# Altium footprint library PcbLib1.PcbLib: 51 footprints (part 1 of 4)
Each footprint in its own frame and in the unit in brackets; x right, y up, seen from the top. Pads: shape width x height; smd on the part's side, far side on the other; paste and mask are expansions set on the pad; w line width, h text height; cw(c..) or ccw(c..) is an arc to the next point about the centre after c.
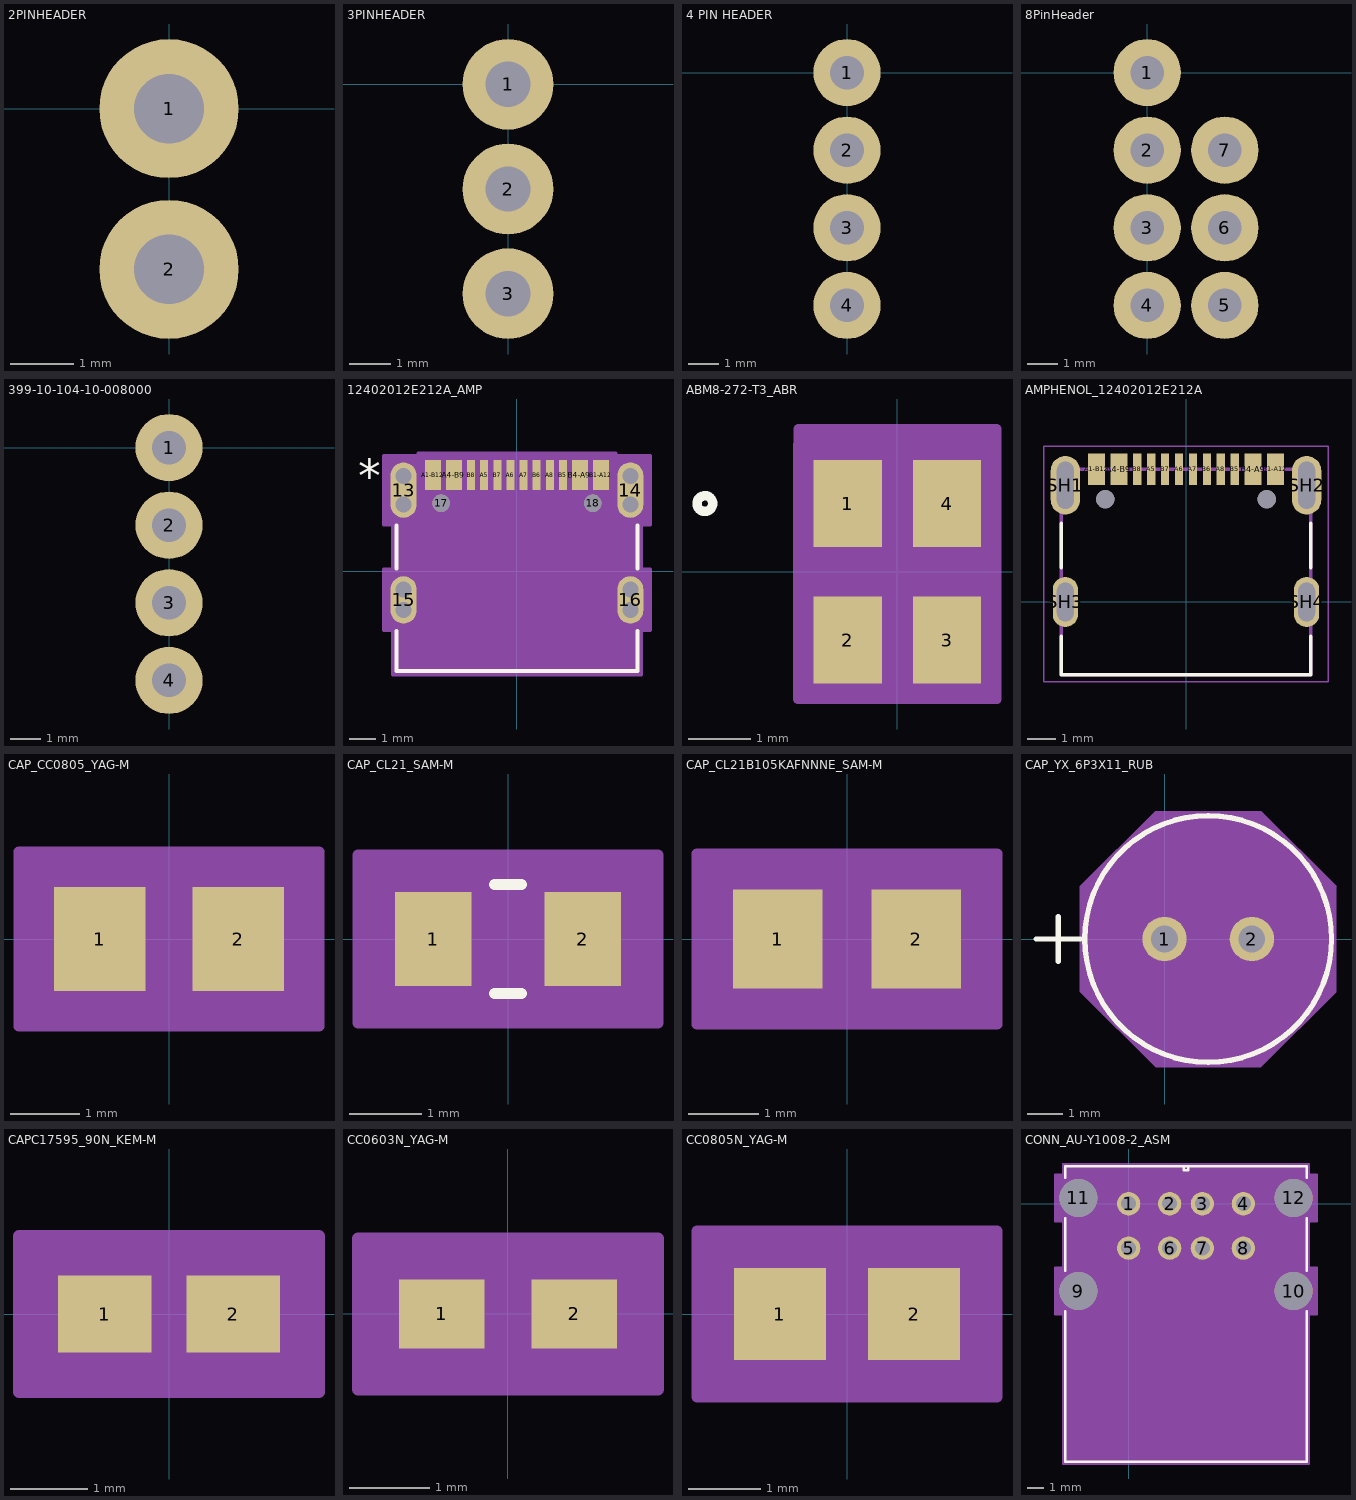
[diagram p0: the footprints below, top view; thin cyan lines are the x and y axes]

## 2PINHEADER [mm]
pads (2):
  round 2.2 hole 1.1: 1(0,0) 2(0,-2.54)

## 3PINHEADER [mm]
pads (3):
  round 2.2 hole 1.1: 1(0,0) 2(0,-2.54) 3(0,-5.08)

## 4 PIN HEADER [mm]
pads (4):
  round 2.2 hole 1.1: 1(0,0) 2(0,-2.54) 3(0,-5.08) 4(0,-7.62)

## 8PinHeader [mm]
pads (7):
  round 2.2 hole 1.1: 1(0,0) 2(0,-2.54) 3(0,-5.08) 4(0,-7.62) 5(2.54,-7.62) 6(2.54,-5.08) 7(2.54,-2.54)

## 399-10-104-10-008000 [mm]
pads (4):
  round 2.2 hole 1.1: 1(0,0) 2(0,-2.54) 3(0,-5.08) 4(0,-7.62)
3D body "mill-max-399-10-104-10-008000.STEP": height 2.95, standoff -2.79, extent -0.224,-8.814 5.588,1.346

## 12402012E212A_AMP [mil]
pads (26):
  oval 39x83 smd paste-41.5 mask-41.5: 13(-170.08,122.06) 14(170.08,122.06)
  oval 39x71 smd paste-35.5 mask-35.5: 15(-170.08,-42.51) 16(170.08,-42.51)
  round 26 / inner round 60 / far side round 26 hole 26 unplated paste-99999 mask-13: 17(-113.78,102.37) 18(113.78,102.37)
  rect 24x45 smd paste+0 mask+0: A1-B12(-125.98,144.5) A4-B9(-94.49,144.5) B1-A12(125.98,144.5) B4-A9(94.49,144.5)
  rect 12x45 smd paste+0 mask+0: A5(-49.21,144.5) A6(-9.84,144.5) A7(9.84,144.5) A8(49.21,144.5) B5(68.9,144.5) B6(29.53,144.5) B7(-29.53,144.5) B8(-68.9,144.5)
  round 24 / inner round 60 / far side round 24 hole 24 unplated paste-99999 mask-12: S_2_H1(-170.08,143.56) S_2_H2(-170.08,100.56) S_3_H1(170.08,143.56) S_3_H2(170.08,100.56) S_4_H1(-170.08,-27.01) S_4_H2(-170.08,-58.01) S_5_H1(170.08,-27.01) S_5_H2(170.08,-58.01)
Top Overlay:
  lines w6: -181,-89.22 -181,-149.5 181,-149.5 181,-89.22 ; -181,4.21 -181,69.34 ; 181,4.21 181,69.34
  text "*" at -238.48,119.5 h50
Mechanical 13:
  lines w1: -176,-144.5 176,-144.5 176,144.5 -176,144.5 -176,-144.5
  text "*" at -238.48,119.5 h50
Mechanical 15:
  region: 199.58,2.99 186,2.99 186,70.56 199.58,70.56 199.58,173.56 147.98,173.56 147.98,177 -147.98,177 -147.98,173.56 -199.58,173.56 -199.58,70.56 -186,70.56 -186,2.99 -199.58,2.99 -199.58,-88.01 -186,-88.01 -186,-154.5 186,-154.5 186,-88.01 199.58,-88.01
  lines w6: -199.58,-88.01 -199.58,2.99 -186,2.99 -186,70.56 -199.58,70.56 -199.58,173.56 -147.98,173.56 -147.98,177 147.98,177 147.98,173.56 199.58,173.56 199.58,70.56 186,70.56 186,2.99 199.58,2.99 199.58,-88.01 186,-88.01 186,-154.5 -186,-154.5 -186,-88.01 -199.58,-88.01
Multi-Layer:
  lines w24: -170.08,-58.01 -170.08,-27.01 ; -170.08,100.56 -170.08,143.56 ; 170.08,-58.01 170.08,-27.01 ; 170.08,100.56 170.08,143.56

## ABM8-272-T3_ABR [mm]
pads (4):
  rect 1.1x1.4 smd paste+0 mask+0: 1(-0.8,1.1) 2(-0.8,-1.1) 3(0.8,-1.1) 4(0.8,1.1)
Top Overlay:
  circle w0.152: c-3.102,1.1 r0.127
Mechanical 13:
  circle w0: c-0.25,1.1 r0.076
  lines w0: -0.305,1.702 ccw(c0,1.702) 0.305,1.702
  lines w0.025: -1.346,-1.702 -1.346,1.702 1.346,1.702 1.346,-1.702 -1.346,-1.702
Mechanical 15:
  region: -1.6,-2.054 -1.604,-2.054 -1.604,2.054 -1.6,2.054 -1.6,2.308 1.6,2.308 1.6,2.054 1.604,2.054 1.604,-2.054 1.6,-2.054
  lines w0.152: -1.604,-2.054 -1.6,-2.054 1.6,-2.054 1.604,-2.054 1.604,2.054 1.6,2.054 1.6,2.308 -1.6,2.308 -1.6,2.054 -1.604,2.054 -1.604,-2.054
3D body "ABM8-272-T3_ABR.step": height 0.76, standoff 0, extent -1.346,-1.702 1.346,1.702

## AMPHENOL_12402012E212A [mm]
height 3.26
pads (18):
  rect 0.6x1.14 smd: A1-B12(-3.2,4.75) A4-B9(-2.4,4.75) B1-A12(3.2,4.75) B4-A9(2.4,4.75)
  rect 0.3x1.14 smd: A5(-1.25,4.75) A6(-0.25,4.75) A7(0.25,4.75) A8(1.25,4.75) B5(1.75,4.75) B6(0.75,4.75) B7(-0.75,4.75) B8(-1.75,4.75)
  oval 1.05x2.1 hole 0.6 slot 1.7 at 90 deg: SH1(-4.32,4.18) SH2(4.32,4.18)
  oval 0.9x1.8 hole 0.6 slot 1.4 at 90 deg: SH3(-4.32,0) SH4(4.32,0)
  round 0.65 hole 0.65 unplated: ""(-2.89,3.68) ""(2.89,3.68)
Top Overlay:
  lines w0.127: -4.47,-1.22 -4.47,-2.6 4.47,-2.6 4.47,-1.22 ; -4.47,1.22 -4.47,2.81 ; 4.47,1.22 4.47,2.81
Mechanical 13:
  lines w0.127: -4.47,-2.6 4.47,-2.6 4.47,4.75 -4.47,4.75 -4.47,-2.6
Mechanical 15:
  lines w0.05: -5.095,-2.85 -5.095,5.57 5.095,5.57 5.095,-2.85 -5.095,-2.85
3D body "step_temp.STEP": height 3.23, standoff -0.93, extent -4.47,-2.54 4.47,5.06

## CAP_CC0805_YAG-M [mil]
pads (2):
  rect 52x59 smd paste+0 mask+0: 1(-39.31,0) 2(39.31,0)
Mechanical 13:
  circle w0: c-34.31,0 r3
  lines w1: -43.31,-28.5 -43.31,28.5 ; -43.31,-28.5 -13.31,-28.5 -13.31,28.5 -43.31,28.5 ; -43.31,-28.5 43.31,-28.5 ; -43.31,-28.5 -43.31,28.5 ; -43.31,28.5 43.31,28.5 ; 43.31,-28.5 13.31,-28.5 13.31,28.5 43.31,28.5 ; 43.31,-28.5 43.31,28.5 ; 43.31,-28.5 43.31,28.5
Mechanical 15:
  region: 85.31,-49.5 -85.31,-49.5 -85.31,49.5 85.31,49.5
  lines w6: -85.31,-49.5 -85.31,49.5 85.31,49.5 85.31,-49.5 -85.31,-49.5
3D body "CAP_CC0805_YAG.step": height 57.01, standoff 0, extent -43.31,-28.5 43.31,28.5

## CAP_CL21_SAM-M [mil]
pads (2):
  rect 41.69x51.21 smd paste+0 mask+0: 1(-40.53,0) 2(40.53,0)
Top Overlay:
  lines w6: -7.21,-29.61 7.21,-29.61 ; -7.21,29.61 7.21,29.61
Mechanical 13:
  circle w0: c-35.53,0 r3
  lines w1: -39.37,-24.61 -39.37,24.61 ; -39.37,-24.61 -19.68,-24.61 -19.68,24.61 -39.37,24.61 ; -39.37,-24.61 39.37,-24.61 ; -39.37,-24.61 -39.37,24.61 ; -39.37,24.61 39.37,24.61 ; 39.37,-24.61 19.68,-24.61 19.68,24.61 39.37,24.61 ; 39.37,-24.61 39.37,24.61 ; 39.37,-24.61 39.37,24.61
Mechanical 15:
  region: 81.37,-45.61 -81.37,-45.61 -81.37,45.61 81.37,45.61
  lines w6: -81.37,-45.61 -81.37,45.61 81.37,45.61 81.37,-45.61 -81.37,-45.61
3D body "CAP_CL21_SAM.step": height 53.15, standoff 0, extent -39.37,-24.61 39.37,24.61

## CAP_CL21B105KAFNNNE_SAM-M [mil]
pads (2):
  rect 50x55 smd paste+0 mask+0: 1(-38.5,0) 2(38.5,0)
Mechanical 13:
  circle w0: c-33.5,0 r3
  lines w1: -41.5,-26.5 -41.5,26.5 ; -41.5,-26.5 -13.5,-26.5 -13.5,26.5 -41.5,26.5 ; -41.5,-26.5 41.5,-26.5 ; -41.5,-26.5 -41.5,26.5 ; -41.5,26.5 41.5,26.5 ; 41.5,-26.5 13.5,-26.5 13.5,26.5 41.5,26.5 ; 41.5,-26.5 41.5,26.5 ; 41.5,-26.5 41.5,26.5
Mechanical 15:
  region: 83.5,-47.5 -83.5,-47.5 -83.5,47.5 83.5,47.5
  lines w6: -83.5,-47.5 -83.5,47.5 83.5,47.5 83.5,-47.5 -83.5,-47.5
3D body "CAP_CL21B105KAFNNNE_SAM.step": height 52.99, standoff 0, extent -41.5,-26.5 41.5,26.5

## CAP_YX_6P3X11_RUB [mil]
pads (2):
  round 50 / inner round 60 / far side round 50 hole 30 paste-99999 mask+0: 1(0,0) 2(98.43,0)
Top Overlay:
  circle w6: c49.21,0 r139
  lines w6: -144.79,0 -94.79,0 ; -119.79,-25 -119.79,25
Mechanical 13:
  circle w0: c49.21,0 r134
  lines w1: -144.79,0 -94.79,0 ; -119.79,-25 -119.79,25
Mechanical 15:
  region: -94.79,59.29 -10.08,144 108.51,144 193.21,59.29 193.21,-59.29 108.51,-144 -10.08,-144 -94.79,-59.29
  lines w1: -94.79,-59.29 -10.08,-144 108.51,-144 193.21,-59.29 193.21,59.29 108.51,144 -10.08,144 -94.79,59.29 -94.79,-59.29
3D body "CAP_YX_6P3X11_RUB.step": height 492.6, standoff -160, extent -84.8,-133.88 184.32,133.88

## CAPC17595_90N_KEM-M [mil]
pads (2):
  rect 47.59x39.4 smd paste+0 mask+0: 1(-32.65,0) 2(32.65,0)
Mechanical 13:
  lines w1: -34.45,-18.7 -34.45,18.7 ; -34.45,-18.7 34.45,-18.7 ; -34.45,-18.7 -14.76,-18.7 -14.76,18.7 -34.45,18.7 ; -34.45,-18.7 -34.45,18.7 ; -34.45,18.7 34.45,18.7 ; 34.45,-18.7 34.45,18.7 ; 34.45,-18.7 34.45,18.7 ; 34.45,-18.7 14.76,-18.7 14.76,18.7 34.45,18.7
Mechanical 15:
  region: 76.45,-39.7 -76.45,-39.7 -76.45,39.7 76.45,39.7
  lines w6: -76.45,-39.7 76.45,-39.7 76.45,39.7 -76.45,39.7 -76.45,-39.7
3D body "CAPC17595_90N_KEM.step": height 35.43, standoff 0, extent -34.45,-18.7 34.45,18.7

## CC0603N_YAG-M [mil]
pads (2):
  rect 42x34 smd paste+0 mask+0: 1(-32.5,0) 2(32.5,0)
Mechanical 13:
  lines w1: -31.5,-16 -31.5,16 ; -31.5,-16 -11.5,-16 -11.5,16 -31.5,16 ; -31.5,-16 31.5,-16 ; -31.5,-16 -31.5,16 ; -31.5,16 31.5,16 ; 31.5,-16 11.5,-16 11.5,16 31.5,16 ; 31.5,-16 31.5,16 ; 31.5,-16 31.5,16
Mechanical 15:
  region: 73.5,-37 -73.5,-37 -73.5,37 73.5,37
  lines w6: -73.5,-37 -73.5,37 73.5,37 73.5,-37 -73.5,-37
3D body "CC0603N_YAG.step": height 27.99, standoff 0, extent -31.5,-15.98 31.5,15.98

## CC0805N_YAG-M [mil]
pads (2):
  rect 50x50 smd paste+0 mask+0: 1(-36.5,0) 2(36.5,0)
Mechanical 13:
  lines w1: -39.5,-24 -39.5,24 ; -39.5,-24 39.5,-24 ; -39.5,-24 -11.5,-24 -11.5,24 -39.5,24 ; -39.5,-24 -39.5,24 ; -39.5,24 39.5,24 ; 39.5,-24 39.5,24 ; 39.5,-24 39.5,24 ; 39.5,-24 11.5,-24 11.5,24 39.5,24
Mechanical 15:
  region: 81.5,-45 -81.5,-45 -81.5,45 81.5,45
  lines w6: -81.5,-45 81.5,-45 81.5,45 -81.5,45 -81.5,-45
3D body "CC0805N_YAG.step": height 27.99, standoff 0, extent -39.49,-24.02 39.49,24.02

## CONN_AU-Y1008-2_ASM [mil]
pads (12):
  round 56 / inner round 60 / far side round 56 hole 36 paste-99999 mask+0: 1(0,0) 2(98.43,0) 3(177.17,0) 4(275.59,0) 5(0,-106.69) 6(98.43,-106.69) 7(177.17,-106.69) 8(275.59,-106.69)
  round 91 / inner round 60 / far side round 91 hole 91 unplated paste-99999 mask-45.5: 9(-120.87,-209.84) 10(396.46,-209.84) 11(-120.87,13.78) 12(396.46,13.78)
Top Overlay:
  lines w6: -152.7,-259.04 -152.7,-620.57 428.3,-620.57 428.3,-259.04 ; -152.7,-160.65 -152.7,-35.42 ; -152.7,62.98 -152.7,90.43 428.3,90.43 428.3,62.98 ; 428.3,-160.65 428.3,-35.42 ; 132.8,80.43 142.8,80.43 142.8,90.43 132.8,90.43 132.8,80.43
  text "*" at -112.5,-25 h50
Mechanical 13:
  lines w1: -147.7,-615.57 423.3,-615.57 423.3,85.43 -147.7,85.43 -147.7,-615.57
  text "*" at -112.5,-25 h50
Mechanical 15:
  region: -157.7,-154.34 -176.37,-154.34 -176.37,-265.34 -157.7,-265.34 -157.7,-625.57 433.3,-625.57 433.3,-265.34 451.96,-265.34 451.96,-154.34 433.3,-154.34 433.3,-41.72 451.96,-41.72 451.96,69.28 433.3,69.28 433.3,95.43 -157.7,95.43 -157.7,69.28 -176.37,69.28 -176.37,-41.72 -157.7,-41.72
  lines w6: -176.37,-265.34 -176.37,-154.34 -157.7,-154.34 -157.7,-41.72 -176.37,-41.72 -176.37,69.28 -157.7,69.28 -157.7,95.43 433.3,95.43 433.3,69.28 451.96,69.28 451.96,-41.72 433.3,-41.72 433.3,-154.34 451.96,-154.34 451.96,-265.34 433.3,-265.34 433.3,-625.57 -157.7,-625.57 -157.7,-265.34 -176.37,-265.34
3D body "AU-Y1008-2.step": height 636.33, standoff -170.76, extent -165.29,-616.39 440.93,72.58